# Altium footprint library Atlan.PcbLib: 283 footprints (part 1 of 18)
Each footprint in its own frame and in the unit in brackets; x right, y up, seen from the top. Pads: shape width x height; smd on the part's side, far side on the other; paste and mask are expansions set on the pad; w line width, h text height; cw(c..) or ccw(c..) is an arc to the next point about the centre after c.
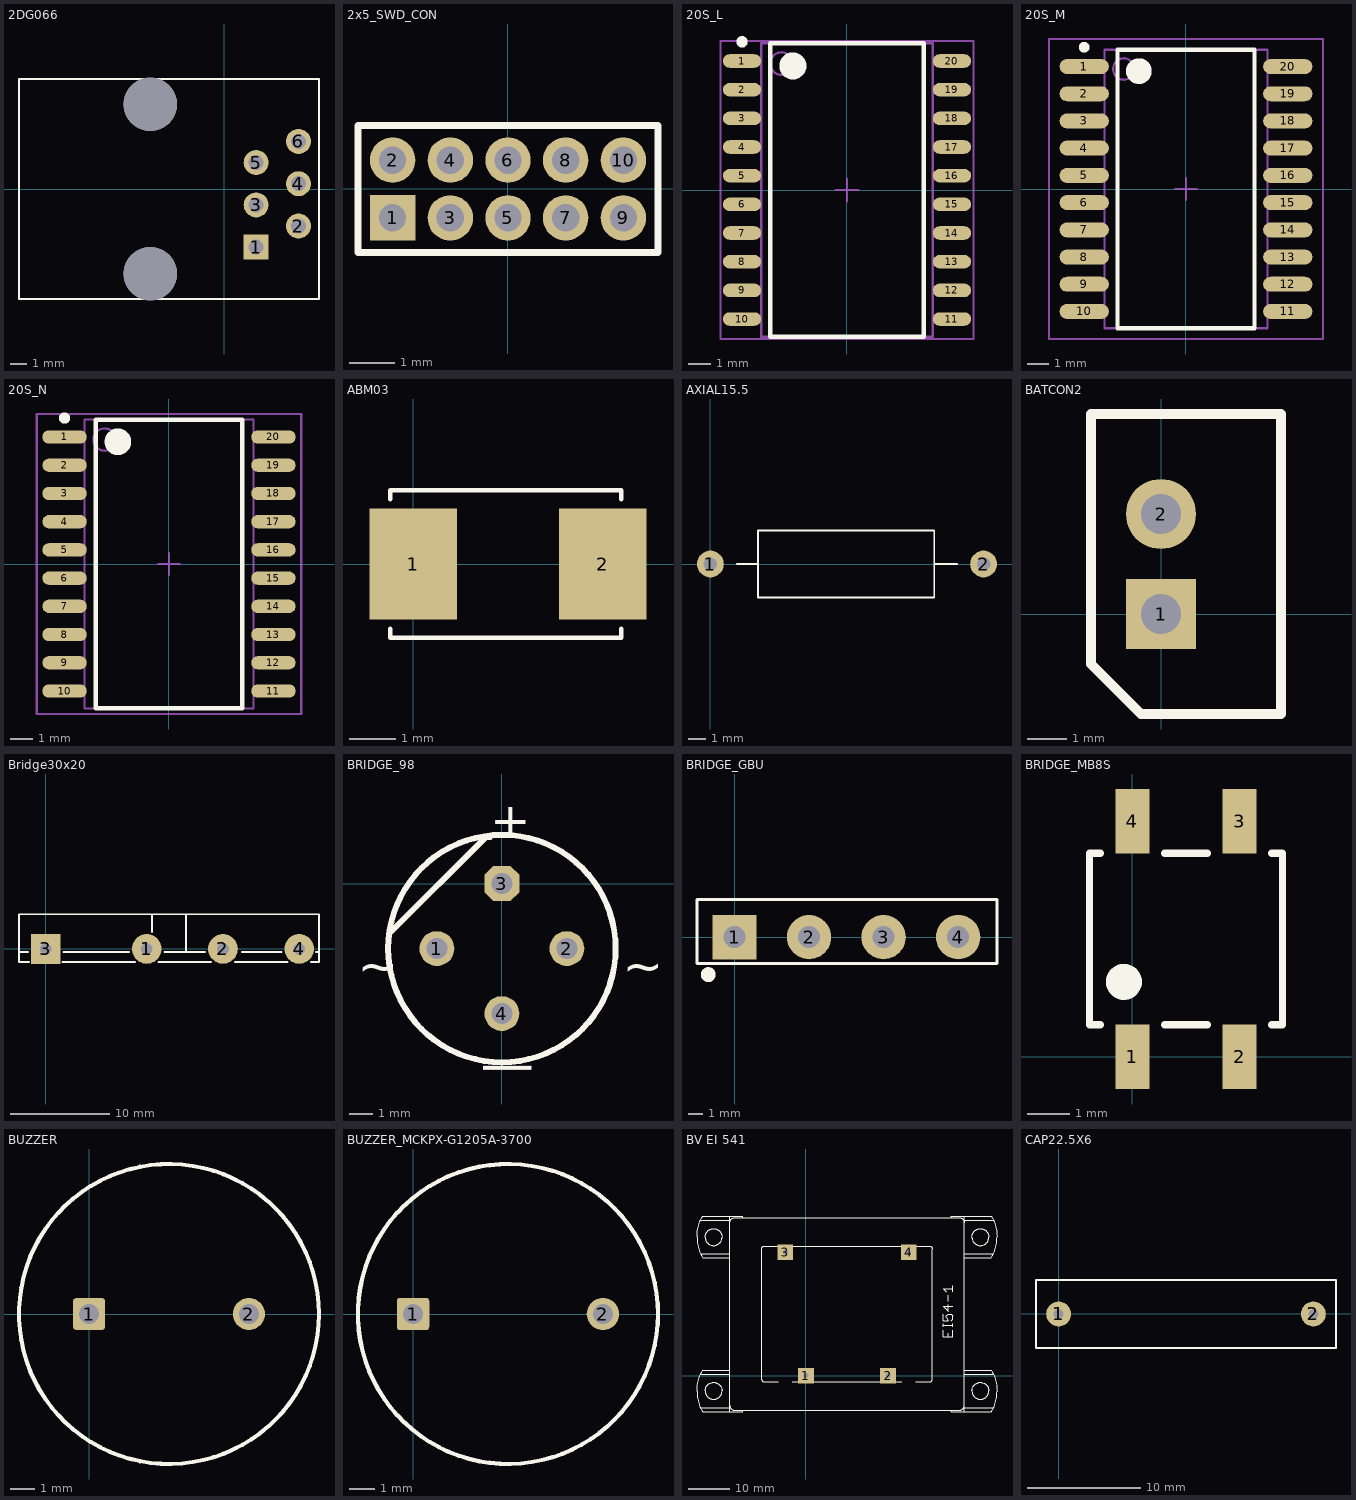
[diagram p0: the footprints below, top view; thin cyan lines are the x and y axes]

## 2DG066 [mm]
pads (8):
  rect 1.5x1.5 hole 0.9: 1(1.905,-3.492)
  round 1.5 hole 0.9: 2(4.445,-2.222) 3(1.905,-0.952) 4(4.445,0.318) 5(1.905,1.588) 6(4.445,2.858)
  round 3.2 hole 3.2 unplated: ""(-4.445,-5.08) ""(-4.445,5.08)
Top Overlay:
  lines w0.1: -12.325,-6.6 -12.325,6.6 5.675,6.6 5.675,-6.6 -12.325,-6.6
3D body: height 11.5, standoff 0, extent -12.325,-6.6 5.675,6.6

## 2x5_SWD_CON [mm]
pads (10):
  rect 1x1 hole 0.6: 1(-2.54,-0.635)
  round 1 hole 0.6: 2(-2.54,0.635) 3(-1.27,-0.635) 4(-1.27,0.635) 5(0,-0.635) 6(0,0.635) 7(1.27,-0.635) 8(1.27,0.635) 9(2.54,-0.635) 10(2.54,0.635)
Top Overlay:
  lines w0.15: -3.302,-1.397 3.302,-1.397 3.302,1.397 -3.302,1.397 -3.302,-1.397

## 20S_L [mm] "SOIC, 20-Leads, Body 12.8x7.5mm, Pitch 1.27mm, IPC High Density"
height 2.67
pads (20):
  oval 1.7x0.6 smd: 1(-4.65,5.715) 2(-4.65,4.445) 3(-4.65,3.175) 4(-4.65,1.905) 5(-4.65,0.635) 6(-4.65,-0.635) 7(-4.65,-1.905) 8(-4.65,-3.175) 9(-4.65,-4.445) 10(-4.65,-5.715) 11(4.65,-5.715) 12(4.65,-4.445) 13(4.65,-3.175) 14(4.65,-1.905) 15(4.65,-0.635) 16(4.65,0.635) 17(4.65,1.905) 18(4.65,3.175) 19(4.65,4.445) 20(4.65,5.715)
Top Overlay:
  circle w0.25: c-4.65,6.565 r0.125
  circle w0.6: c-2.4,5.5 r0.3
  lines w0.2: -3.4,-6.5 -3.4,6.5 3.4,6.5 3.4,-6.5 -3.4,-6.5
Mechanical 13:
  circle w0.1: c-2.9,5.6 r0.5
  lines w0.1: -3.8,-6.5 -3.8,6.5 3.8,6.5 3.8,-6.5 -3.8,-6.5
Mechanical 15:
  lines w0.1: -0.5,0 0.5,0 ; 0,-0.5 0,0.5 ; -5.6,-6.6 -5.6,6.6 5.6,6.6 5.6,-6.6 -5.6,-6.6
3D body: height 2.67, standoff 0, extent -3.8,-6.5 3.8,6.5

## 20S_M [mm] "SOIC, 20-Leads, Body 12.8x7.5mm, Pitch 1.27mm, IPC Low Density"
height 2.67
pads (20):
  oval 2.3x0.7 smd: 1(-4.75,5.715) 2(-4.75,4.445) 3(-4.75,3.175) 4(-4.75,1.905) 5(-4.75,0.635) 6(-4.75,-0.635) 7(-4.75,-1.905) 8(-4.75,-3.175) 9(-4.75,-4.445) 10(-4.75,-5.715) 11(4.75,-5.715) 12(4.75,-4.445) 13(4.75,-3.175) 14(4.75,-1.905) 15(4.75,-0.635) 16(4.75,0.635) 17(4.75,1.905) 18(4.75,3.175) 19(4.75,4.445) 20(4.75,5.715)
Top Overlay:
  circle w0.25: c-4.75,6.615 r0.125
  circle w0.6: c-2.2,5.5 r0.3
  lines w0.2: -3.2,-6.5 -3.2,6.5 3.2,6.5 3.2,-6.5 -3.2,-6.5
Mechanical 13:
  circle w0.1: c-2.9,5.6 r0.5
  lines w0.1: -3.8,-6.5 -3.8,6.5 3.8,6.5 3.8,-6.5 -3.8,-6.5
Mechanical 15:
  lines w0.1: -0.5,0 0.5,0 ; 0,-0.5 0,0.5 ; -6.4,-7 -6.4,7 6.4,7 6.4,-7 -6.4,-7
3D body: height 2.67, standoff 0, extent -3.8,-6.5 3.8,6.5

## 20S_N [mm] "SOIC, 20-Leads, Body 12.8x7.5mm, Pitch 1.27mm, IPC Medium Density"
height 2.67
pads (20):
  oval 2x0.6 smd: 1(-4.7,5.715) 2(-4.7,4.445) 3(-4.7,3.175) 4(-4.7,1.905) 5(-4.7,0.635) 6(-4.7,-0.635) 7(-4.7,-1.905) 8(-4.7,-3.175) 9(-4.7,-4.445) 10(-4.7,-5.715) 11(4.7,-5.715) 12(4.7,-4.445) 13(4.7,-3.175) 14(4.7,-1.905) 15(4.7,-0.635) 16(4.7,0.635) 17(4.7,1.905) 18(4.7,3.175) 19(4.7,4.445) 20(4.7,5.715)
Top Overlay:
  circle w0.25: c-4.7,6.565 r0.125
  circle w0.6: c-2.3,5.5 r0.3
  lines w0.2: -3.3,-6.5 -3.3,6.5 3.3,6.5 3.3,-6.5 -3.3,-6.5
Mechanical 13:
  circle w0.1: c-2.9,5.6 r0.5
  lines w0.1: -3.8,-6.5 -3.8,6.5 3.8,6.5 3.8,-6.5 -3.8,-6.5
Mechanical 15:
  lines w0.1: -0.5,0 0.5,0 ; 0,-0.5 0,0.5 ; -5.95,-6.75 -5.95,6.75 5.95,6.75 5.95,-6.75 -5.95,-6.75
3D body: height 2.67, standoff 0, extent -3.8,-6.5 3.8,6.5

## ABM03 [mm] "Q?"
pads (2):
  rect 1.9x2.4 smd: 1(0,0) 2(4.1,0)
Top Overlay:
  lines w0.1: -0.5,-1.4 -0.5,-1.6 4.5,-1.6 4.5,-1.4 ; -0.5,1.4 -0.5,1.6 4.5,1.6 4.5,1.4

## AXIAL15.5 [mil]
pads (2):
  round 60 hole 30: 1(0,0) 2(610.24,0)
Top Overlay:
  lines w4: 59.06,0 106.3,0 ; 500,0 551.18,0 ; 106.3,0 106.3,74.8 500,74.8 500,-74.8 106.3,-74.8 106.3,0
3D body: height 113.58, standoff -35.43, extent 106.3,-74.8 500,74.51

## BATCON2 [mil]
pads (2):
  rect 70x70 hole 40: 1(0,0)
  round 70 hole 40: 2(0,100)
Top Overlay:
  lines w10: -70,-50 -20,-100 120,-100 120,200 -70,200 -70,-50

## Bridge30x20 [mm]
pads (4):
  round 3 hole 1.2: 1(10.2,0) 2(17.9,0) 4(25.6,0)
  rect 3x3 hole 1.2: 3(0,0)
Top Overlay:
  lines w0.2: -2.7,-0.3 -1.8,-0.3 ; -1.7,-1.3 -2.7,-1.3 -2.7,3.5 27.6,3.5 27.6,-1.3 26.8,-1.3 ; 1.7,-1.3 9,-1.3 ; 1.8,-0.3 8.4,-0.3 ; 10.75,1.7 10.75,3.5 ; 11.4,-1.3 16.7,-1.3 ; 12,-0.3 16.1,-0.3 ; 14.15,-0.3 14.15,3.5 ; 19.1,-1.3 24.4,-1.3 ; 19.8,-0.3 23.8,-0.3 ; 27.3,-0.3 27.6,-0.3
3D body: height 20.3, standoff 0, extent -2.7,-1.3 27.6,3.5

## BRIDGE_98 [mm] "Bridge"
pads (4):
  round 1.5 hole 0.9: 1(-2.8,-2.8) 2(2.8,-2.8) 4(0,-5.6)
  oct 1.5x1.5 hole 0.9: 3(0,0)
Top Overlay:
  circle w0.254: c0,-2.8 r4.9
  lines w0.25: -4.8,-2.1 -0.7,2 -0.5,2
  text "~" at -6.2,-4.3 h1.52
  text "~" at 5.2,-4.3 h1.52
  text "|" at 0.8,-8.3 h1.52
  text "+" at -0.5,2 h1.52

## BRIDGE_GBU [mm]
pads (4):
  rect 3x3 hole 1.5: 1(0,0)
  round 3 hole 1.5: 2(5.05,0) 3(10.1,0) 4(15.15,0)
Top Overlay:
  circle w0.5: c-1.778,-2.54 r0.254
  lines w0.2: -2.54,-1.778 17.78,-1.778 17.78,2.54 -2.54,2.54 -2.54,-1.778
3D body: height 18.7, standoff 1.6, extent -2.516,-1.778 17.78,2.54

## BRIDGE_MB8S [mm]
height 2.5
pads (4):
  rect 0.8x1.5 smd: 1(0,0) 2(2.5,0) 3(2.5,5.5) 4(0,5.5)
Top Overlay:
  circle w0.5: c-0.2,1.75 r0.17
  lines w0.17: -0.75,0.75 -1,0.75 -1,4.75 -0.75,4.75 ; 0.75,0.75 1.75,0.75 ; 0.75,4.75 1.75,4.75 ; 3.25,0.75 3.5,0.75 3.5,4.75 3.25,4.75

## BUZZER [mm]
height 7.6
pads (2):
  rrect20% 1.3x1.3 hole 0.8: 1(0,0)
  round 1.3 hole 0.8: 2(6.5,0)
Top Overlay:
  circle w0.17: c3.25,0 r6.1
3D body: height 7.6, standoff 0, extent -2.804,-6.076 9.348,6.1

## BUZZER_MCKPX-G1205A-3700 [mm]
height 9.5
pads (2):
  rrect20% 1.3x1.3 hole 0.8: 1(0,0)
  round 1.3 hole 0.8: 2(7.6,0)
Top Overlay:
  circle w0.17: c3.8,0 r6
3D body: height 9.5, standoff 0, extent -2.153,-5.988 9.8,5.988

## BV EI 541 [mil]
pads (4):
  rect 150x150 hole 47: 1(0,0) 2(788,0) 3(-197,1182) 4(985,1182)
Top Overlay:
  drawing of 653 lines, arcs and shapes, not listed
3D body "BV_EI_541_1_TR.STEP": height 1559.06, standoff 0, extent -1051.18,-346.46 1827.74,1533.54

## CAP22.5X6 [mm]
pads (2):
  round 2.2 hole 0.9: 1(0,0) 2(22.5,0)
Top Overlay:
  lines w0.15: -2,-3 -2,3 24.5,3 24.5,-3 -2,-3
3D body: height 14, standoff 0, extent -2,-3 24.5,3